# Altium footprint library LibraryProject.PcbLib: 20 footprints (part 1 of 2)
Each footprint in its own frame and in the unit in brackets; x right, y up, seen from the top. Pads: shape width x height; smd on the part's side, far side on the other; paste and mask are expansions set on the pad; w line width, h text height; cw(c..) or ccw(c..) is an arc to the next point about the centre after c.
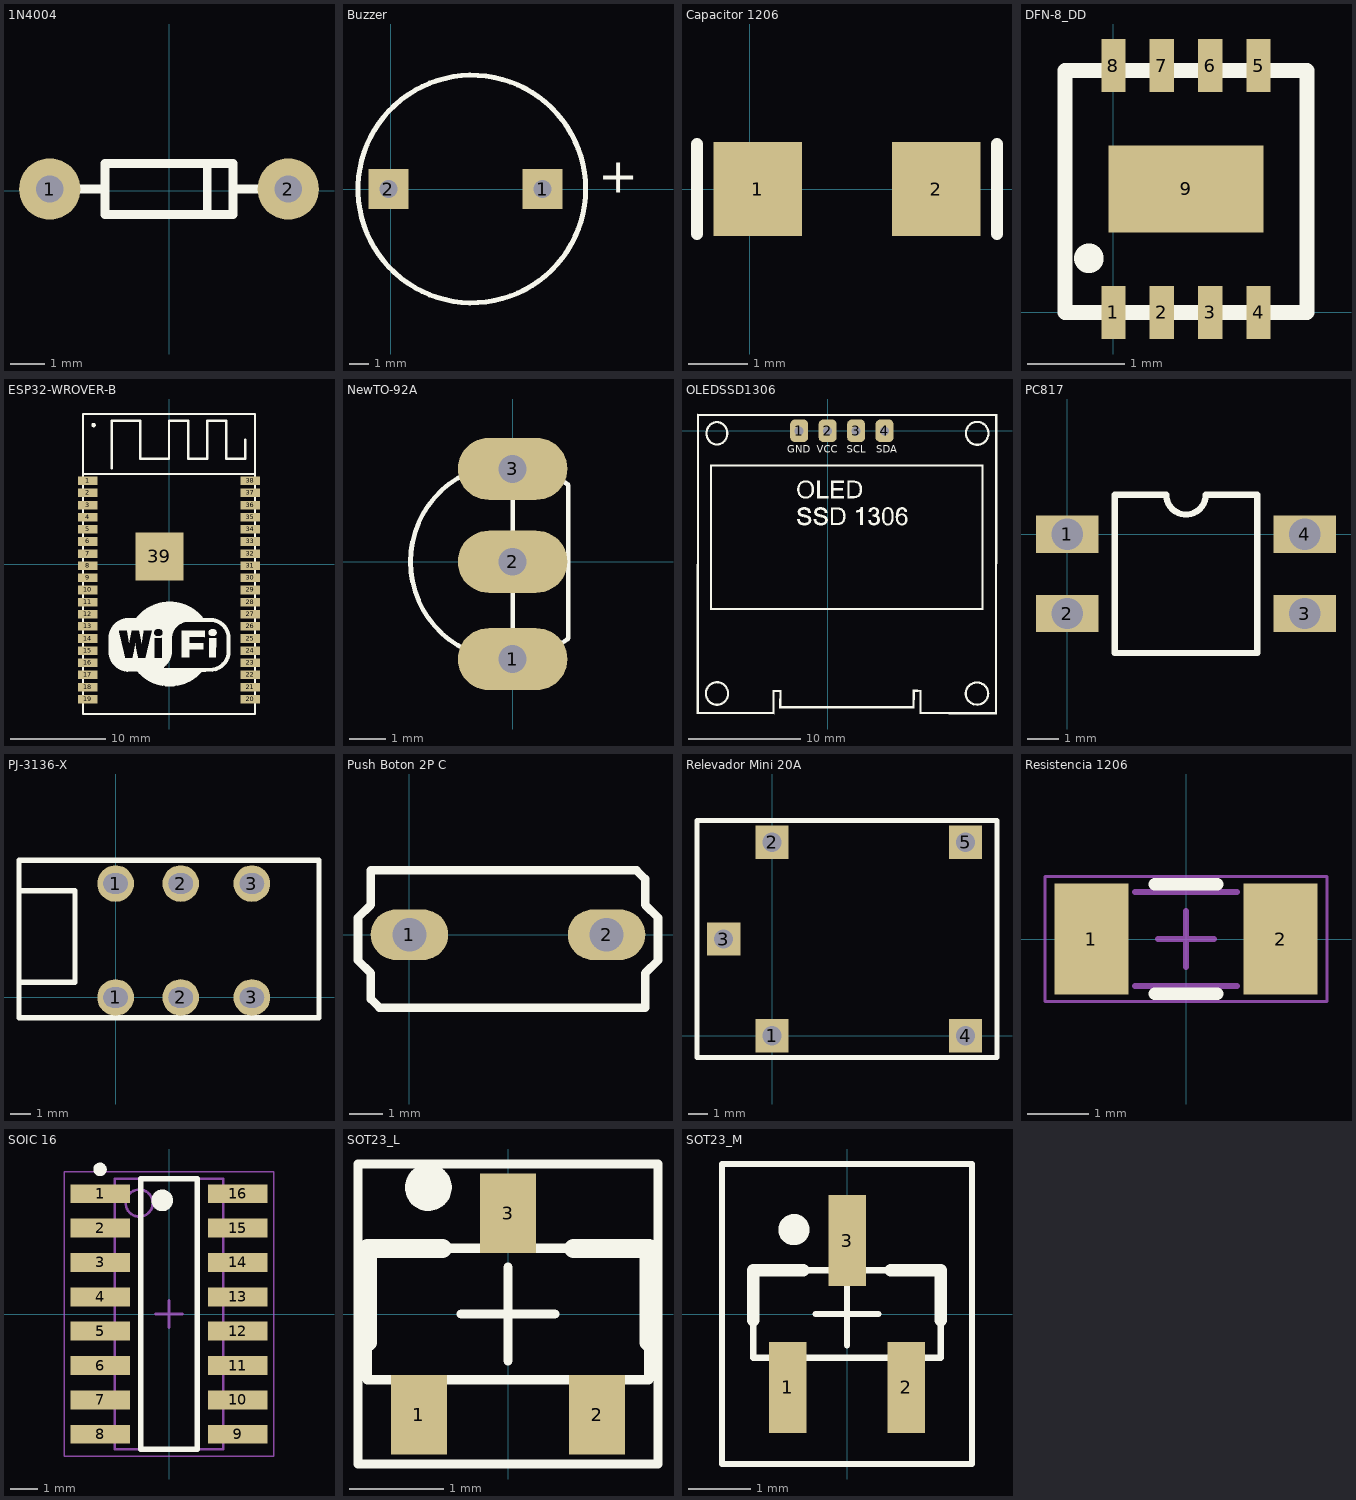
[diagram p0: the footprints below, top view; thin cyan lines are the x and y axes]

## 1N4004 [mm]
pads (2):
  round 1.8 hole 0.8: 1(-3.5,0.05) 2(3.5,0.05)
Top Overlay:
  lines w0.254: -2.625,0.05 -1.875,0.05 ; 1.125,-0.7 1.125,0.8 ; 1.875,0.05 2.625,0.05 ; -1.875,0.05 -1.875,-0.7 -0.125,-0.7 1.625,-0.7 1.875,-0.7 1.875,0.8 1.625,0.8 -0.125,0.8 -1.875,0.8 -1.875,0.05
3D body "User Library-Diode 1N4004 x7mm (pcb).step": height 4.31, standoff -0.9, extent -3.9,-1.31 3.9,1.31

## Buzzer [mm] "Buzzer 5V"
pads (2):
  rect 2x2 hole 0.9: 1(7.62,0) 2(-0.127,0)
Top Overlay:
  circle w0.254: c4.064,0 r5.715
  text "+" at 10.414,-0.762 h3
3D body "Buzzer.step": height 10.65, standoff -3.5, extent -2.266,-6.096 13.188,5.904

## Capacitor 1206 [mm] "Capacitor Ceramico 1206"
pads (2):
  rect 1.5x1.6 smd: 1(0.139,0) 2(3.163,0)
Top Overlay:
  lines w0.2: -0.889,-0.762 -0.889,0.762 ; 4.191,-0.762 4.191,0.762
3D body "1206 SMD Capacitor.step": height 1, standoff 0, extent 0.051,-0.8 3.251,0.8

## DFN-8_DD [mm]
pads (9):
  rect 0.25x0.55 smd: 1(0,0) 2(0.5,0) 3(1,0) 4(1.5,0) 5(1.5,2.55) 6(1,2.55) 7(0.5,2.55) 8(0,2.55)
  rect 1.6x0.9 smd: 9(0.75,1.275)
Top Overlay:
  circle w0.254: c-0.254,0.559 r0.025
  lines w0.154: -0.5,0 2,0 2,2.5 -0.5,2.5 -0.5,0
3D body "DFN-8_SHT3X.step": height 0.9, standoff -0.01, extent -0.5,0 2,2.52

## ESP32-WROVER-B [mm]
height 15
pads (39):
  rect 2x0.9 smd: 1(-8.5,8.71) 2(-8.5,7.44) 3(-8.5,6.17) 4(-8.5,4.9) 5(-8.5,3.63) 6(-8.5,2.36) 7(-8.5,1.09) 8(-8.5,-0.18) 9(-8.5,-1.45) 10(-8.5,-2.72) 11(-8.5,-3.99) 12(-8.5,-5.26) 13(-8.5,-6.53) 14(-8.5,-7.8) 15(-8.5,-9.07) 16(-8.5,-10.34) 17(-8.5,-11.61) 18(-8.5,-12.88) 19(-8.5,-14.15) 20(8.5,-14.15) 21(8.5,-12.88) 22(8.5,-11.61) 23(8.5,-10.34) 24(8.5,-9.07) 25(8.5,-7.8) 26(8.5,-6.53) 27(8.5,-5.26) 28(8.5,-3.99) 29(8.5,-2.72) 30(8.5,-1.45) 31(8.5,-0.18) 32(8.5,1.09) 33(8.5,2.36) 34(8.5,3.63) 35(8.5,4.9) 36(8.5,6.17) 37(8.5,7.44) 38(8.5,8.71)
  rect 5x5 smd: 39(-1,0.79)
Top Overlay:
  drawing of 24 lines, arcs and shapes, not listed
3D body "ESP32-WROVER-B.STEP": height 3.3, standoff 0, extent -8.953,-15.693 9.047,15.707

## NewTO-92A [mm]
pads (3):
  oval 3x1.7 hole 0.762: 1(0,-2.664) 2(0,0) 3(0,2.54)
Top Overlay:
  lines w0.127: 0.985,2.425 cw(c-0.127,0) 1.524,2.095 1.524,-2.095 cw(c-0.127,0) 1.009,-2.414 cw(c-0.127,0) 0,-2.664 ; 1.009,2.413 ccw(c-0.127,0) 0,2.664 ; 0,-2.664 cw(c-0.127,0) -1.263,-2.413 cw(c-0.127,0) -1.263,2.413 cw(c-0.127,0) 0,2.664 ; 0,-2.664 0,-1.404 0,-1.136 0,1.136 0,1.404 0,2.664
3D body "User Library-TO-92-4.step": height 13.33, standoff -4.7, extent -2.66,-2.888 1.53,2.852

## OLEDSSD1306 [mm]
pads (4):
  rrect50% 1.6x2 hole 0.8: 1(-2.54,0) 2(0,0) 3(2.54,0) 4(5.08,0)
Top Overlay:
  drawing of 17 lines, arcs and shapes, not listed
  text "GND" at -3.581,-2.197 h1.1
  text "VCC" at -0.965,-2.198 h1.1
  text "SCL" at 1.702,-2.197 h1.1
  text "SDA" at 4.343,-2.197 h1.1
3D body "SSD1306_OLED_Display(128x64).step": height 6.3, standoff -5.5, extent -11.379,-24.981 14.021,1.219

## PC817 [mm] "OPTOACOPLADOR"
pads (4):
  rect 2x1.2 hole 1: 1(0,0) 2(0,-2.54) 3(7.62,-2.54) 4(7.62,0)
Top Overlay:
  lines w0.2: 1.524,-3.81 6.096,-3.81 6.096,1.27 4.445,1.27 cw(c3.81,1.27) 3.175,1.27 1.524,1.27 1.524,-3.81
3D body "PDIP 4.step": height 4.5, standoff -2.5, extent -0.13,-3.565 7.75,1.025

## PCBComponent_1 [mm]

## PJ-3136-X [mm] "PJ-3136-X"
pads (6):
  round 1.8 hole 1 slot 1.2 at 0 deg: 1(0,0) 1(0,5.6) 2(3.2,0) 2(3.2,5.6) 3(6.7,0) 3(6.7,5.6)
Top Overlay:
  lines w0.254: -4.75,-1 -4.75,6.75 -4.5,6.75 10,6.75 10,-0.75 10,-1 -4.75,-1 ; -4.75,0.75 -2,0.75 -2,5.25 -4.75,5.25 -4.75,0.75
3D body "TRS Jack PJ-313.stp": height 7.51, standoff -0.51, extent -4.332,-0.588 9.668,6.218

## Push Boton 2P C [mm] "Push Boton TH 6x4 2 pines cortos"
pads (2):
  oval 2.3x1.5 hole 1: 1(0,0) 2(5.842,0)
Top Overlay:
  lines w0.254: -1.524,-0.762 -1.524,0.508 -1.143,0.889 -1.143,1.905 6.731,1.905 6.985,1.651 6.985,0.889 7.366,0.508 7.366,-0.762 6.985,-1.143 6.985,-2.159 -0.889,-2.159 -1.143,-1.905 -1.143,-1.143 -1.524,-0.762
3D body "PB 2P TH Cortos-DTS-32.STEP": height 5.3, standoff -3.2, extent -0.957,-1.75 6.799,1.75

## Relevador Mini 20A [mm] "Relevador Mini 20A"
pads (5):
  rect 1.75x1.75 hole 1: 1(0,0) 2(0,10.16) 3(-2.54,5.08) 4(10.16,0) 5(10.16,10.16)
Top Overlay:
  lines w0.254: -3.937,-1.143 -3.937,11.303 11.811,11.303 11.811,-1.143 -3.937,-1.143
3D body: height 3, standoff 0, extent 9.61,-0.549 10.706,0.549
3D body: height 2, standoff -1, extent -0.547,-0.485 0.548,0.612
3D body: height 2, standoff -1, extent -3.09,4.531 -1.994,5.629
3D body: height 2, standoff -1, extent -0.55,9.611 0.546,10.709
3D body: height 2, standoff -1, extent 9.61,9.611 10.706,10.709
3D body: height 15, standoff 0.5, extent -3.937,-1.27 11.684,11.43

## Resistencia 1206 [mm] "Resistencia 1206 SMD"
pads (2):
  rect 1.2x1.8 smd: 1(-1.535,0) 2(1.535,0)
Top Overlay:
  lines w0.2: -0.508,-0.889 0.508,-0.889 ; -0.508,0.889 0.508,0.889
Mechanical 13:
  lines w0.1: -0.825,-0.762 0.825,-0.762 ; -0.825,0.762 0.825,0.762
Mechanical 15:
  lines w0.05: -2.286,-1.016 2.286,-1.016 2.286,1.016 -2.286,1.016 -2.286,-1.016
  lines w0.1: -0.45,0 0.45,0 ; 0,-0.45 0,0.45
3D body "Resistencia 12'6.STEP": height 0.85, standoff 0, extent -1.675,-0.865 1.675,0.865

## SOIC 16 [mm] "SOIC 16P 1.27mm"
height 2
pads (16):
  rect 2.2x0.7 smd: 1(-2.55,4.445) 2(-2.55,3.175) 3(-2.55,1.905) 4(-2.55,0.635) 5(-2.55,-0.635) 6(-2.55,-1.905) 7(-2.55,-3.175) 8(-2.55,-4.445) 9(2.55,-4.445) 10(2.55,-3.175) 11(2.55,-1.905) 12(2.55,-0.635) 13(2.55,0.635) 14(2.55,1.905) 15(2.55,3.175) 16(2.55,4.445)
Top Overlay:
  circle w0.25: c-2.55,5.345 r0.125
  circle w0.4: c-0.25,4.2 r0.2
  lines w0.2: -1.05,-5 -1.05,5 1.05,5 1.05,-5 -1.05,-5
Mechanical 13:
  circle w0.1: c-1.1,4.1 r0.5
  lines w0.1: -2,-5 -2,5 2,5 2,-5 -2,-5
Mechanical 15:
  lines w0.05: -3.875,-5.25 -3.875,5.25 3.875,5.25 3.875,-5.25 -3.875,-5.25
  lines w0.1: -0.5,0 0.5,0 ; 0,-0.5 0,0.5
3D body "SOIC 16.step": height 1.4, standoff 0, extent -3,-4.95 3,4.95

## SOT23_L [mm] "SOT23, 3-Leads, Body 2.9x1.3mm, Pitch 0.95mm, Lead Span 2.3mm - Reverse Pinning, IPC High Density"
height 1.1
pads (3):
  rect 0.6x0.85 smd: 1(-0.95,-1.075) 2(0.95,-1.075) 3(0,1.075)
Top Overlay:
  circle w0.25: c-0.85,1.35 r0.125
  lines w0.1: -0.5,0 0.5,0 ; 0,-0.5 0,0.5 ; -1.6,-1.6 -1.6,1.6 1.6,1.6 1.6,-1.6 -1.6,-1.6 ; -1.5,-0.7 -1.5,0.7 1.5,0.7 1.5,-0.7 -1.5,-0.7
  lines w0.2: -1.5,-0.3 -1.5,0.7 -0.7,0.7 ; 0.7,0.7 1.5,0.7 1.5,-0.3
3D body "sot23-3_p0-95_l3-04_w1-4.stp": height 0.94, standoff -0.1, extent -1.52,-1.32 1.52,1.32

## SOT23_M [mm] "SOT23, 3-Leads, Body 2.9x1.3mm, Pitch 0.95mm, Lead Span 2.3mm - Reverse Pinning, IPC Low Density"
height 1.1
pads (3):
  rect 0.6x1.45 smd: 1(-0.95,-1.175) 2(0.95,-1.175) 3(0,1.175)
Top Overlay:
  circle w0.25: c-0.85,1.35 r0.125
  lines w0.1: -0.5,0 0.5,0 ; 0,-0.5 0,0.5 ; -2,-2.4 -2,2.4 2,2.4 2,-2.4 -2,-2.4 ; -1.5,-0.7 -1.5,0.7 1.5,0.7 1.5,-0.7 -1.5,-0.7
  lines w0.2: -1.5,-0.1 -1.5,0.7 -0.7,0.7 ; 0.7,0.7 1.5,0.7 1.5,-0.1
3D body "sot23-3_p0-95_l3-04_w1-4.stp": height 0.94, standoff -0.1, extent -1.52,-1.37 1.52,1.27